# Altium footprint library CONN_B2B_SEARAY.PcbLib: 3 footprints
Each footprint in its own frame and in the unit in brackets; x right, y up, seen from the top. Pads: shape width x height; smd on the part's side, far side on the other; paste and mask are expansions set on the pad; w line width, h text height; cw(c..) or ccw(c..) is an arc to the next point about the centre after c.
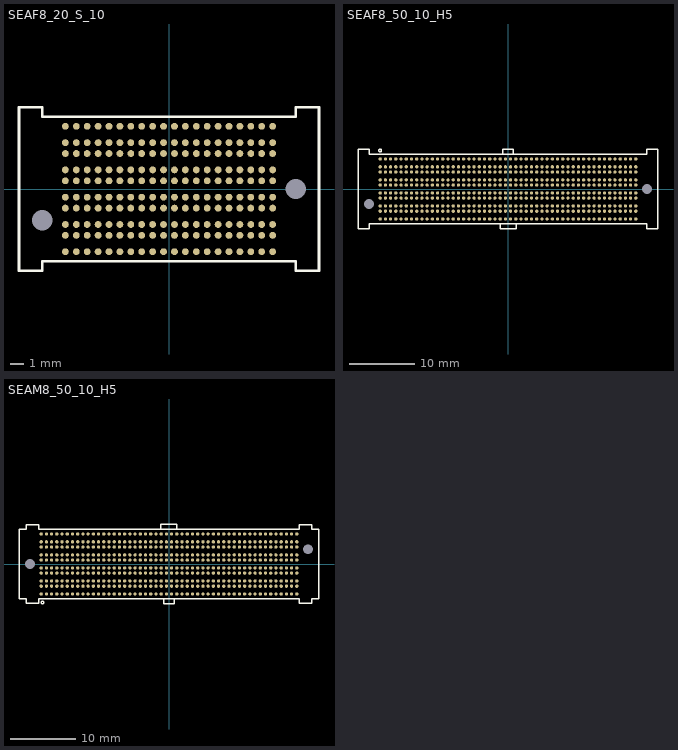
[diagram p0: the footprints below, top view; thin cyan lines are the x and y axes]

## SEAF8_20_S_10 [mm] "CONN, B2B, SAMTEC, SEAF8-20-05.0-S-10-2-K"
pads (402):
  round 0.5 smd paste+0.064 mask+0.05: A1(-7.6,4.6) A2(-6.8,4.6) A3(-6,4.6) A4(-5.2,4.6) A5(-4.4,4.6) A6(-3.6,4.6) A7(-2.8,4.6) A8(-2,4.6) A9(-1.2,4.6) A10(-0.4,4.6) A11(0.4,4.6) A12(1.2,4.6) A13(2,4.6) A14(2.8,4.6) A15(3.6,4.6) A16(4.4,4.6) A17(5.2,4.6) A18(6,4.6) A19(6.8,4.6) A20(7.6,4.6) B1(-7.6,3.4) B2(-6.8,3.4) B3(-6,3.4) B4(-5.2,3.4) B5(-4.4,3.4) B6(-3.6,3.4) B7(-2.8,3.4) B8(-2,3.4) B9(-1.2,3.4) B10(-0.4,3.4) B11(0.4,3.4) B12(1.2,3.4) B13(2,3.4) B14(2.8,3.4) B15(3.6,3.4) B16(4.4,3.4) B17(5.2,3.4) B18(6,3.4) B19(6.8,3.4) B20(7.6,3.4) C1(-7.6,2.6) C2(-6.8,2.6) C3(-6,2.6) C4(-5.2,2.6) C5(-4.4,2.6) C6(-3.6,2.6) C7(-2.8,2.6) C8(-2,2.6) C9(-1.2,2.6) C10(-0.4,2.6) C11(0.4,2.6) C12(1.2,2.6) C13(2,2.6) C14(2.8,2.6) C15(3.6,2.6) C16(4.4,2.6) C17(5.2,2.6) C18(6,2.6) C19(6.8,2.6) C20(7.6,2.6) D1(-7.6,1.4) D2(-6.8,1.4) D3(-6,1.4) D4(-5.2,1.4) D5(-4.4,1.4) D6(-3.6,1.4) D7(-2.8,1.4) D8(-2,1.4) D9(-1.2,1.4) D10(-0.4,1.4) D11(0.4,1.4) D12(1.2,1.4) D13(2,1.4) D14(2.8,1.4) D15(3.6,1.4) D16(4.4,1.4) D17(5.2,1.4) D18(6,1.4) D19(6.8,1.4) D20(7.6,1.4) E1(-7.6,0.6) E2(-6.8,0.6) E3(-6,0.6) E4(-5.2,0.6) E5(-4.4,0.6) E6(-3.6,0.6) E7(-2.8,0.6) E8(-2,0.6) E9(-1.2,0.6) E10(-0.4,0.6) E11(0.4,0.6) E12(1.2,0.6) E13(2,0.6) E14(2.8,0.6) E15(3.6,0.6) E16(4.4,0.6) E17(5.2,0.6) E18(6,0.6) E19(6.8,0.6) E20(7.6,0.6) F1(-7.6,-0.6) F2(-6.8,-0.6) F3(-6,-0.6) F4(-5.2,-0.6) F5(-4.4,-0.6) F6(-3.6,-0.6) F7(-2.8,-0.6) F8(-2,-0.6) F9(-1.2,-0.6) F10(-0.4,-0.6) F11(0.4,-0.6) F12(1.2,-0.6) F13(2,-0.6) F14(2.8,-0.6) F15(3.6,-0.6) F16(4.4,-0.6) F17(5.2,-0.6) F18(6,-0.6) F19(6.8,-0.6) F20(7.6,-0.6) G1(-7.6,-1.4) G2(-6.8,-1.4) G3(-6,-1.4) G4(-5.2,-1.4) G5(-4.4,-1.4) G6(-3.6,-1.4) G7(-2.8,-1.4) G8(-2,-1.4) G9(-1.2,-1.4) G10(-0.4,-1.4) G11(0.4,-1.4) G12(1.2,-1.4) G13(2,-1.4) G14(2.8,-1.4) G15(3.6,-1.4) G16(4.4,-1.4) G17(5.2,-1.4) G18(6,-1.4) G19(6.8,-1.4) G20(7.6,-1.4) H1(-7.6,-2.6) H2(-6.8,-2.6) H3(-6,-2.6) H4(-5.2,-2.6) H5(-4.4,-2.6) H6(-3.6,-2.6) H7(-2.8,-2.6) H8(-2,-2.6) H9(-1.2,-2.6) H10(-0.4,-2.6) H11(0.4,-2.6) H12(1.2,-2.6) H13(2,-2.6) H14(2.8,-2.6) H15(3.6,-2.6) H16(4.4,-2.6) H17(5.2,-2.6) H18(6,-2.6) H19(6.8,-2.6) H20(7.6,-2.6) J1(-7.6,-3.4) J2(-6.8,-3.4) J3(-6,-3.4) J4(-5.2,-3.4) J5(-4.4,-3.4) J6(-3.6,-3.4) J7(-2.8,-3.4) J8(-2,-3.4) J9(-1.2,-3.4) J10(-0.4,-3.4) J11(0.4,-3.4) J12(1.2,-3.4) J13(2,-3.4) J14(2.8,-3.4) J15(3.6,-3.4) J16(4.4,-3.4) J17(5.2,-3.4) J18(6,-3.4) J19(6.8,-3.4) J20(7.6,-3.4) K1(-7.6,-4.6) K2(-6.8,-4.6) K3(-6,-4.6) K4(-5.2,-4.6) K5(-4.4,-4.6) K6(-3.6,-4.6) K7(-2.8,-4.6) K8(-2,-4.6) K9(-1.2,-4.6) K10(-0.4,-4.6) K11(0.4,-4.6) K12(1.2,-4.6) K13(2,-4.6) K14(2.8,-4.6) K15(3.6,-4.6) K16(4.4,-4.6) K17(5.2,-4.6) K18(6,-4.6) K19(6.8,-4.6) K20(7.6,-4.6)
  round 0 hole 1.5 unplated: ""(-9.3,-2.3) ""(9.3,0)
  oval 0.65x0.7 on Top Paste: ""(-7.6,-4.55) ""(-7.6,-3.45) ""(-7.6,-2.55) ""(-7.6,-1.45) ""(-7.6,-0.55) ""(-7.6,0.55) ""(-7.6,1.45) ""(-7.6,2.55) ""(-7.6,3.45) ""(-7.6,4.55) ""(-6.8,-4.55) ""(-6.8,-3.45) ""(-6.8,-2.55) ""(-6.8,-1.45) ""(-6.8,-0.55) ""(-6.8,0.55) ""(-6.8,1.45) ""(-6.8,2.55) ""(-6.8,3.45) ""(-6.8,4.55) ""(-6,-4.55) ""(-6,-3.45) ""(-6,-2.55) ""(-6,-1.45) ""(-6,-0.55) ""(-6,0.55) ""(-6,1.45) ""(-6,2.55) ""(-6,3.45) ""(-6,4.55) ""(-5.2,-4.55) ""(-5.2,-3.45) ""(-5.2,-2.55) ""(-5.2,-1.45) ""(-5.2,-0.55) ""(-5.2,0.55) ""(-5.2,1.45) ""(-5.2,2.55) ""(-5.2,3.45) ""(-5.2,4.55) ""(-4.4,-4.55) ""(-4.4,-3.45) ""(-4.4,-2.55) ""(-4.4,-1.45) ""(-4.4,-0.55) ""(-4.4,0.55) ""(-4.4,1.45) ""(-4.4,2.55) ""(-4.4,3.45) ""(-4.4,4.55) ""(-3.6,-4.55) ""(-3.6,-3.45) ""(-3.6,-2.55) ""(-3.6,-1.45) ""(-3.6,-0.55) ""(-3.6,0.55) ""(-3.6,1.45) ""(-3.6,2.55) ""(-3.6,3.45) ""(-3.6,4.55) ""(-2.8,-4.55) ""(-2.8,-3.45) ""(-2.8,-2.55) ""(-2.8,-1.45) ""(-2.8,-0.55) ""(-2.8,0.55) ""(-2.8,1.45) ""(-2.8,2.55) ""(-2.8,3.45) ""(-2.8,4.55) ""(-2,-4.55) ""(-2,-3.45) ""(-2,-2.55) ""(-2,-1.45) ""(-2,-0.55) ""(-2,0.55) ""(-2,1.45) ""(-2,2.55) ""(-2,3.45) ""(-2,4.55) ""(-1.2,-4.55) ""(-1.2,-3.45) ""(-1.2,-2.55) ""(-1.2,-1.45) ""(-1.2,-0.55) ""(-1.2,0.55) ""(-1.2,1.45) ""(-1.2,2.55) ""(-1.2,3.45) ""(-1.2,4.55) ""(-0.4,-4.55) ""(-0.4,-3.45) ""(-0.4,-2.55) ""(-0.4,-1.45) ""(-0.4,-0.55) ""(-0.4,0.55) ""(-0.4,1.45) ""(-0.4,2.55) ""(-0.4,3.45) ""(-0.4,4.55) ""(0.4,-4.55) ""(0.4,-3.45) ""(0.4,-2.55) ""(0.4,-1.45) ""(0.4,-0.55) ""(0.4,0.55) ""(0.4,1.45) ""(0.4,2.55) ""(0.4,3.45) ""(0.4,4.55) ""(1.2,-4.55) ""(1.2,-3.45) ""(1.2,-2.55) ""(1.2,-1.45) ""(1.2,-0.55) ""(1.2,0.55) ""(1.2,1.45) ""(1.2,2.55) ""(1.2,3.45) ""(1.2,4.55) ""(2,-4.55) ""(2,-3.45) ""(2,-2.55) ""(2,-1.45) ""(2,-0.55) ""(2,0.55) ""(2,1.45) ""(2,2.55) ""(2,3.45) ""(2,4.55) ""(2.8,-4.55) ""(2.8,-3.45) ""(2.8,-2.55) ""(2.8,-1.45) ""(2.8,-0.55) ""(2.8,0.55) ""(2.8,1.45) ""(2.8,2.55) ""(2.8,3.45) ""(2.8,4.55) ""(3.6,-4.55) ""(3.6,-3.45) ""(3.6,-2.55) ""(3.6,-1.45) ""(3.6,-0.55) ""(3.6,0.55) ""(3.6,1.45) ""(3.6,2.55) ""(3.6,3.45) ""(3.6,4.55) ""(4.4,-4.55) ""(4.4,-3.45) ""(4.4,-2.55) ""(4.4,-1.45) ""(4.4,-0.55) ""(4.4,0.55) ""(4.4,1.45) ""(4.4,2.55) ""(4.4,3.45) ""(4.4,4.55) ""(5.2,-4.55) ""(5.2,-3.45) ""(5.2,-2.55) ""(5.2,-1.45) ""(5.2,-0.55) ""(5.2,0.55) ""(5.2,1.45) ""(5.2,2.55) ""(5.2,3.45) ""(5.2,4.55) ""(6,-4.55) ""(6,-3.45) ""(6,-2.55) ""(6,-1.45) ""(6,-0.55) ""(6,0.55) ""(6,1.45) ""(6,2.55) ""(6,3.45) ""(6,4.55) ""(6.8,-4.55) ""(6.8,-3.45) ""(6.8,-2.55) ""(6.8,-1.45) ""(6.8,-0.55) ""(6.8,0.55) ""(6.8,1.45) ""(6.8,2.55) ""(6.8,3.45) ""(6.8,4.55) ""(7.6,-4.55) ""(7.6,-3.45) ""(7.6,-2.55) ""(7.6,-1.45) ""(7.6,-0.55) ""(7.6,0.55) ""(7.6,1.45) ""(7.6,2.55) ""(7.6,3.45) ""(7.6,4.55)
Top Overlay:
  lines w0.2: -11,-6 -11,6 -9.3,6 -9.3,5.3 9.3,5.3 9.3,6 11,6 11,-6 9.3,-6 9.3,-5.3 -9.3,-5.3 -9.3,-6 -11,-6
3D body "SEAF8-20-05.0-S-10-2-K.stp": height 4.65, standoff -1.32, extent -10.92,-5.9 10.92,5.9

## SEAF8_50_10_H5 [mm] "CONN, B2B, SAMTEC, SEAF8-50-05.0-L-10-2-K"
height 5
pads (502):
  round 0.5 smd paste-1 mask+0.05: A01(-19.6,4.6) A02(-18.8,4.6) A03(-18,4.6) A04(-17.2,4.6) A05(-16.4,4.6) A06(-15.6,4.6) A07(-14.8,4.6) A08(-14,4.6) A09(-13.2,4.6) A10(-12.4,4.6) A11(-11.6,4.6) A12(-10.8,4.6) A13(-10,4.6) A14(-9.2,4.6) A15(-8.4,4.6) A16(-7.6,4.6) A17(-6.8,4.6) A18(-6,4.6) A19(-5.2,4.6) A20(-4.4,4.6) A21(-3.6,4.6) A22(-2.8,4.6) A23(-2,4.6) A24(-1.2,4.6) A25(-0.4,4.6) A26(0.4,4.6) A27(1.2,4.6) A28(2,4.6) A29(2.8,4.6) A30(3.6,4.6) A31(4.4,4.6) A32(5.2,4.6) A33(6,4.6) A34(6.8,4.6) A35(7.6,4.6) A36(8.4,4.6) A37(9.2,4.6) A38(10,4.6) A39(10.8,4.6) A40(11.6,4.6) A41(12.4,4.6) A42(13.2,4.6) A43(14,4.6) A44(14.8,4.6) A45(15.6,4.6) A46(16.4,4.6) A47(17.2,4.6) A48(18,4.6) A49(18.8,4.6) A50(19.6,4.6) B01(-19.6,3.4) B02(-18.8,3.4) B03(-18,3.4) B04(-17.2,3.4) B05(-16.4,3.4) B06(-15.6,3.4) B07(-14.8,3.4) B08(-14,3.4) B09(-13.2,3.4) B10(-12.4,3.4) B11(-11.6,3.4) B12(-10.8,3.4) B13(-10,3.4) B14(-9.2,3.4) B15(-8.4,3.4) B16(-7.6,3.4) B17(-6.8,3.4) B18(-6,3.4) B19(-5.2,3.4) B20(-4.4,3.4) B21(-3.6,3.4) B22(-2.8,3.4) B23(-2,3.4) B24(-1.2,3.4) B25(-0.4,3.4) B26(0.4,3.4) B27(1.2,3.4) B28(2,3.4) B29(2.8,3.4) B30(3.6,3.4) B31(4.4,3.4) B32(5.2,3.4) B33(6,3.4) B34(6.8,3.4) B35(7.6,3.4) B36(8.4,3.4) B37(9.2,3.4) B38(10,3.4) B39(10.8,3.4) B40(11.6,3.4) B41(12.4,3.4) B42(13.2,3.4) B43(14,3.4) B44(14.8,3.4) B45(15.6,3.4) B46(16.4,3.4) B47(17.2,3.4) B48(18,3.4) B49(18.8,3.4) B50(19.6,3.4) C01(-19.6,2.6) C02(-18.8,2.6) C03(-18,2.6) C04(-17.2,2.6) C05(-16.4,2.6) C06(-15.6,2.6) C07(-14.8,2.6) C08(-14,2.6) C09(-13.2,2.6) C10(-12.4,2.6) C11(-11.6,2.6) C12(-10.8,2.6) C13(-10,2.6) C14(-9.2,2.6) C15(-8.4,2.6) C16(-7.6,2.6) C17(-6.8,2.6) C18(-6,2.6) C19(-5.2,2.6) C20(-4.4,2.6) C21(-3.6,2.6) C22(-2.8,2.6) C23(-2,2.6) C24(-1.2,2.6) C25(-0.4,2.6) C26(0.4,2.6) C27(1.2,2.6) C28(2,2.6) C29(2.8,2.6) C30(3.6,2.6) C31(4.4,2.6) C32(5.2,2.6) C33(6,2.6) C34(6.8,2.6) C35(7.6,2.6) C36(8.4,2.6) C37(9.2,2.6) C38(10,2.6) C39(10.8,2.6) C40(11.6,2.6) C41(12.4,2.6) C42(13.2,2.6) C43(14,2.6) C44(14.8,2.6) C45(15.6,2.6) C46(16.4,2.6) C47(17.2,2.6) C48(18,2.6) C49(18.8,2.6) C50(19.6,2.6) D01(-19.6,1.4) D02(-18.8,1.4) D03(-18,1.4) D04(-17.2,1.4) D05(-16.4,1.4) D06(-15.6,1.4) D07(-14.8,1.4) D08(-14,1.4) D09(-13.2,1.4) D10(-12.4,1.4) D11(-11.6,1.4) D12(-10.8,1.4) D13(-10,1.4) D14(-9.2,1.4) D15(-8.4,1.4) D16(-7.6,1.4) D17(-6.8,1.4) D18(-6,1.4) D19(-5.2,1.4) D20(-4.4,1.4) D21(-3.6,1.4) D22(-2.8,1.4) D23(-2,1.4) D24(-1.2,1.4) D25(-0.4,1.4) D26(0.4,1.4) D27(1.2,1.4) D28(2,1.4) D29(2.8,1.4) D30(3.6,1.4) D31(4.4,1.4) D32(5.2,1.4) D33(6,1.4) D34(6.8,1.4) D35(7.6,1.4) D36(8.4,1.4) D37(9.2,1.4) D38(10,1.4) D39(10.8,1.4) D40(11.6,1.4) D41(12.4,1.4) D42(13.2,1.4) D43(14,1.4) D44(14.8,1.4) D45(15.6,1.4) D46(16.4,1.4) D47(17.2,1.4) D48(18,1.4) D49(18.8,1.4) D50(19.6,1.4) E01(-19.6,0.6) E02(-18.8,0.6) E03(-18,0.6) E04(-17.2,0.6) E05(-16.4,0.6) E06(-15.6,0.6) E07(-14.8,0.6) E08(-14,0.6) E09(-13.2,0.6) E10(-12.4,0.6) E11(-11.6,0.6) E12(-10.8,0.6) E13(-10,0.6) E14(-9.2,0.6) E15(-8.4,0.6) E16(-7.6,0.6) E17(-6.8,0.6) E18(-6,0.6) E19(-5.2,0.6) E20(-4.4,0.6) E21(-3.6,0.6) E22(-2.8,0.6) E23(-2,0.6) E24(-1.2,0.6) E25(-0.4,0.6) E26(0.4,0.6) E27(1.2,0.6) E28(2,0.6) E29(2.8,0.6) E30(3.6,0.6) E31(4.4,0.6) E32(5.2,0.6) E33(6,0.6) E34(6.8,0.6) E35(7.6,0.6) E36(8.4,0.6) E37(9.2,0.6) E38(10,0.6) E39(10.8,0.6) E40(11.6,0.6) E41(12.4,0.6) E42(13.2,0.6) E43(14,0.6) E44(14.8,0.6) E45(15.6,0.6) E46(16.4,0.6) E47(17.2,0.6) E48(18,0.6) E49(18.8,0.6) E50(19.6,0.6) F01(-19.6,-0.6) F02(-18.8,-0.6) F03(-18,-0.6) F04(-17.2,-0.6) F05(-16.4,-0.6) F06(-15.6,-0.6) F07(-14.8,-0.6) F08(-14,-0.6) F09(-13.2,-0.6) F10(-12.4,-0.6) F11(-11.6,-0.6) F12(-10.8,-0.6) F13(-10,-0.6) F14(-9.2,-0.6) F15(-8.4,-0.6) F16(-7.6,-0.6) F17(-6.8,-0.6) F18(-6,-0.6) F19(-5.2,-0.6) F20(-4.4,-0.6) F21(-3.6,-0.6) F22(-2.8,-0.6) F23(-2,-0.6) F24(-1.2,-0.6) F25(-0.4,-0.6) F26(0.4,-0.6) F27(1.2,-0.6) F28(2,-0.6) F29(2.8,-0.6) F30(3.6,-0.6) F31(4.4,-0.6) F32(5.2,-0.6) F33(6,-0.6) F34(6.8,-0.6) F35(7.6,-0.6) F36(8.4,-0.6) F37(9.2,-0.6) F38(10,-0.6) F39(10.8,-0.6) F40(11.6,-0.6) F41(12.4,-0.6) F42(13.2,-0.6) F43(14,-0.6) F44(14.8,-0.6) F45(15.6,-0.6) F46(16.4,-0.6) F47(17.2,-0.6) F48(18,-0.6) F49(18.8,-0.6) F50(19.6,-0.6) G01(-19.6,-1.4) G02(-18.8,-1.4) G03(-18,-1.4) G04(-17.2,-1.4) G05(-16.4,-1.4) G06(-15.6,-1.4) G07(-14.8,-1.4) G08(-14,-1.4) G09(-13.2,-1.4) G10(-12.4,-1.4) G11(-11.6,-1.4) G12(-10.8,-1.4) G13(-10,-1.4) G14(-9.2,-1.4) G15(-8.4,-1.4) G16(-7.6,-1.4) G17(-6.8,-1.4) G18(-6,-1.4) G19(-5.2,-1.4) G20(-4.4,-1.4) G21(-3.6,-1.4) G22(-2.8,-1.4) G23(-2,-1.4) G24(-1.2,-1.4) G25(-0.4,-1.4) G26(0.4,-1.4) G27(1.2,-1.4) G28(2,-1.4) G29(2.8,-1.4) G30(3.6,-1.4) G31(4.4,-1.4) G32(5.2,-1.4) G33(6,-1.4) G34(6.8,-1.4) G35(7.6,-1.4) G36(8.4,-1.4) G37(9.2,-1.4) G38(10,-1.4) G39(10.8,-1.4) G40(11.6,-1.4) G41(12.4,-1.4) G42(13.2,-1.4) G43(14,-1.4) G44(14.8,-1.4) G45(15.6,-1.4) G46(16.4,-1.4) G47(17.2,-1.4) G48(18,-1.4) G49(18.8,-1.4) G50(19.6,-1.4) H01(-19.6,-2.6) H02(-18.8,-2.6) H03(-18,-2.6) H04(-17.2,-2.6) H05(-16.4,-2.6) H06(-15.6,-2.6) H07(-14.8,-2.6) H08(-14,-2.6) H09(-13.2,-2.6) H10(-12.4,-2.6) H11(-11.6,-2.6) H12(-10.8,-2.6) H13(-10,-2.6) H14(-9.2,-2.6) H15(-8.4,-2.6) H16(-7.6,-2.6) H17(-6.8,-2.6) H18(-6,-2.6) H19(-5.2,-2.6) H20(-4.4,-2.6) H21(-3.6,-2.6) H22(-2.8,-2.6) H23(-2,-2.6) H24(-1.2,-2.6) H25(-0.4,-2.6) H26(0.4,-2.6) H27(1.2,-2.6) H28(2,-2.6) H29(2.8,-2.6) H30(3.6,-2.6) H31(4.4,-2.6) H32(5.2,-2.6) H33(6,-2.6) H34(6.8,-2.6) H35(7.6,-2.6) H36(8.4,-2.6) H37(9.2,-2.6) H38(10,-2.6) H39(10.8,-2.6) H40(11.6,-2.6) H41(12.4,-2.6) H42(13.2,-2.6) H43(14,-2.6) H44(14.8,-2.6) H45(15.6,-2.6) H46(16.4,-2.6) H47(17.2,-2.6) H48(18,-2.6) H49(18.8,-2.6) H50(19.6,-2.6) I01(-19.6,-3.4) I02(-18.8,-3.4) I03(-18,-3.4) I04(-17.2,-3.4) I05(-16.4,-3.4) I06(-15.6,-3.4) I07(-14.8,-3.4) I08(-14,-3.4) I09(-13.2,-3.4) I10(-12.4,-3.4) I11(-11.6,-3.4) I12(-10.8,-3.4) I13(-10,-3.4) I14(-9.2,-3.4) I15(-8.4,-3.4) I16(-7.6,-3.4) I17(-6.8,-3.4) I18(-6,-3.4) I19(-5.2,-3.4) I20(-4.4,-3.4) I21(-3.6,-3.4) I22(-2.8,-3.4) I23(-2,-3.4) I24(-1.2,-3.4) I25(-0.4,-3.4) I26(0.4,-3.4) I27(1.2,-3.4) I28(2,-3.4) I29(2.8,-3.4) I30(3.6,-3.4) I31(4.4,-3.4) I32(5.2,-3.4) I33(6,-3.4) I34(6.8,-3.4) I35(7.6,-3.4) I36(8.4,-3.4) I37(9.2,-3.4) I38(10,-3.4) I39(10.8,-3.4) I40(11.6,-3.4) I41(12.4,-3.4) I42(13.2,-3.4) I43(14,-3.4) I44(14.8,-3.4) I45(15.6,-3.4) I46(16.4,-3.4) I47(17.2,-3.4) I48(18,-3.4) I49(18.8,-3.4) I50(19.6,-3.4) J01(-19.6,-4.6) J02(-18.8,-4.6) J03(-18,-4.6) J04(-17.2,-4.6) J05(-16.4,-4.6) J06(-15.6,-4.6) J07(-14.8,-4.6) J08(-14,-4.6) J09(-13.2,-4.6) J10(-12.4,-4.6) J11(-11.6,-4.6) J12(-10.8,-4.6) J13(-10,-4.6) J14(-9.2,-4.6) J15(-8.4,-4.6) J16(-7.6,-4.6) J17(-6.8,-4.6) J18(-6,-4.6) J19(-5.2,-4.6) J20(-4.4,-4.6) J21(-3.6,-4.6) J22(-2.8,-4.6) J23(-2,-4.6) J24(-1.2,-4.6) J25(-0.4,-4.6) J26(0.4,-4.6) J27(1.2,-4.6) J28(2,-4.6) J29(2.8,-4.6) J30(3.6,-4.6) J31(4.4,-4.6) J32(5.2,-4.6) J33(6,-4.6) J34(6.8,-4.6) J35(7.6,-4.6) J36(8.4,-4.6) J37(9.2,-4.6) J38(10,-4.6) J39(10.8,-4.6) J40(11.6,-4.6) J41(12.4,-4.6) J42(13.2,-4.6) J43(14,-4.6) J44(14.8,-4.6) J45(15.6,-4.6) J46(16.4,-4.6) J47(17.2,-4.6) J48(18,-4.6) J49(18.8,-4.6) J50(19.6,-4.6)
  round 0 hole 1.5 unplated: ""(-21.3,-2.3) ""(21.3,0)
Top Overlay:
  circle w0.2: c-19.6,5.9 r0.2
  lines w0.2: -1.2,-5.3 -1.2,-6.1 1.25,-6.1 1.25,-5.3 ; -0.8,5.3 -0.8,6.1 0.8,6.1 0.8,5.3 ; -23,-6.1 -21.3,-6.1 -21.3,-5.3 21.3,-5.3 21.3,-6.1 23,-6.1 23,6.1 21.3,6.1 21.3,5.3 -21.3,5.3 -21.3,6.1 -23,6.1 -23,-6.1
Top Paste:
  drawing of 500 lines, arcs and shapes, not listed
3D body "SEAF8-50-05.0-L-10-2-K.stp": height 4.65, standoff -1.32, extent -22.92,-5.98 22.92,5.98

## SEAM8_50_10_H5 [mm] "CONN, B2B, SAMTEC, SEAM8-50-S02.0-L-10-2"
height 5
pads (502):
  round 0.5 smd paste-1 mask+0.05: A01(-19.6,-4.6) A02(-18.8,-4.6) A03(-18,-4.6) A04(-17.2,-4.6) A05(-16.4,-4.6) A06(-15.6,-4.6) A07(-14.8,-4.6) A08(-14,-4.6) A09(-13.2,-4.6) A10(-12.4,-4.6) A11(-11.6,-4.6) A12(-10.8,-4.6) A13(-10,-4.6) A14(-9.2,-4.6) A15(-8.4,-4.6) A16(-7.6,-4.6) A17(-6.8,-4.6) A18(-6,-4.6) A19(-5.2,-4.6) A20(-4.4,-4.6) A21(-3.6,-4.6) A22(-2.8,-4.6) A23(-2,-4.6) A24(-1.2,-4.6) A25(-0.4,-4.6) A26(0.4,-4.6) A27(1.2,-4.6) A28(2,-4.6) A29(2.8,-4.6) A30(3.6,-4.6) A31(4.4,-4.6) A32(5.2,-4.6) A33(6,-4.6) A34(6.8,-4.6) A35(7.6,-4.6) A36(8.4,-4.6) A37(9.2,-4.6) A38(10,-4.6) A39(10.8,-4.6) A40(11.6,-4.6) A41(12.4,-4.6) A42(13.2,-4.6) A43(14,-4.6) A44(14.8,-4.6) A45(15.6,-4.6) A46(16.4,-4.6) A47(17.2,-4.6) A48(18,-4.6) A49(18.8,-4.6) A50(19.6,-4.6) B01(-19.6,-3.4) B02(-18.8,-3.4) B03(-18,-3.4) B04(-17.2,-3.4) B05(-16.4,-3.4) B06(-15.6,-3.4) B07(-14.8,-3.4) B08(-14,-3.4) B09(-13.2,-3.4) B10(-12.4,-3.4) B11(-11.6,-3.4) B12(-10.8,-3.4) B13(-10,-3.4) B14(-9.2,-3.4) B15(-8.4,-3.4) B16(-7.6,-3.4) B17(-6.8,-3.4) B18(-6,-3.4) B19(-5.2,-3.4) B20(-4.4,-3.4) B21(-3.6,-3.4) B22(-2.8,-3.4) B23(-2,-3.4) B24(-1.2,-3.4) B25(-0.4,-3.4) B26(0.4,-3.4) B27(1.2,-3.4) B28(2,-3.4) B29(2.8,-3.4) B30(3.6,-3.4) B31(4.4,-3.4) B32(5.2,-3.4) B33(6,-3.4) B34(6.8,-3.4) B35(7.6,-3.4) B36(8.4,-3.4) B37(9.2,-3.4) B38(10,-3.4) B39(10.8,-3.4) B40(11.6,-3.4) B41(12.4,-3.4) B42(13.2,-3.4) B43(14,-3.4) B44(14.8,-3.4) B45(15.6,-3.4) B46(16.4,-3.4) B47(17.2,-3.4) B48(18,-3.4) B49(18.8,-3.4) B50(19.6,-3.4) C01(-19.6,-2.6) C02(-18.8,-2.6) C03(-18,-2.6) C04(-17.2,-2.6) C05(-16.4,-2.6) C06(-15.6,-2.6) C07(-14.8,-2.6) C08(-14,-2.6) C09(-13.2,-2.6) C10(-12.4,-2.6) C11(-11.6,-2.6) C12(-10.8,-2.6) C13(-10,-2.6) C14(-9.2,-2.6) C15(-8.4,-2.6) C16(-7.6,-2.6) C17(-6.8,-2.6) C18(-6,-2.6) C19(-5.2,-2.6) C20(-4.4,-2.6) C21(-3.6,-2.6) C22(-2.8,-2.6) C23(-2,-2.6) C24(-1.2,-2.6) C25(-0.4,-2.6) C26(0.4,-2.6) C27(1.2,-2.6) C28(2,-2.6) C29(2.8,-2.6) C30(3.6,-2.6) C31(4.4,-2.6) C32(5.2,-2.6) C33(6,-2.6) C34(6.8,-2.6) C35(7.6,-2.6) C36(8.4,-2.6) C37(9.2,-2.6) C38(10,-2.6) C39(10.8,-2.6) C40(11.6,-2.6) C41(12.4,-2.6) C42(13.2,-2.6) C43(14,-2.6) C44(14.8,-2.6) C45(15.6,-2.6) C46(16.4,-2.6) C47(17.2,-2.6) C48(18,-2.6) C49(18.8,-2.6) C50(19.6,-2.6) D01(-19.6,-1.4) D02(-18.8,-1.4) D03(-18,-1.4) D04(-17.2,-1.4) D05(-16.4,-1.4) D06(-15.6,-1.4) D07(-14.8,-1.4) D08(-14,-1.4) D09(-13.2,-1.4) D10(-12.4,-1.4) D11(-11.6,-1.4) D12(-10.8,-1.4) D13(-10,-1.4) D14(-9.2,-1.4) D15(-8.4,-1.4) D16(-7.6,-1.4) D17(-6.8,-1.4) D18(-6,-1.4) D19(-5.2,-1.4) D20(-4.4,-1.4) D21(-3.6,-1.4) D22(-2.8,-1.4) D23(-2,-1.4) D24(-1.2,-1.4) D25(-0.4,-1.4) D26(0.4,-1.4) D27(1.2,-1.4) D28(2,-1.4) D29(2.8,-1.4) D30(3.6,-1.4) D31(4.4,-1.4) D32(5.2,-1.4) D33(6,-1.4) D34(6.8,-1.4) D35(7.6,-1.4) D36(8.4,-1.4) D37(9.2,-1.4) D38(10,-1.4) D39(10.8,-1.4) D40(11.6,-1.4) D41(12.4,-1.4) D42(13.2,-1.4) D43(14,-1.4) D44(14.8,-1.4) D45(15.6,-1.4) D46(16.4,-1.4) D47(17.2,-1.4) D48(18,-1.4) D49(18.8,-1.4) D50(19.6,-1.4) E01(-19.6,-0.6) E02(-18.8,-0.6) E03(-18,-0.6) E04(-17.2,-0.6) E05(-16.4,-0.6) E06(-15.6,-0.6) E07(-14.8,-0.6) E08(-14,-0.6) E09(-13.2,-0.6) E10(-12.4,-0.6) E11(-11.6,-0.6) E12(-10.8,-0.6) E13(-10,-0.6) E14(-9.2,-0.6) E15(-8.4,-0.6) E16(-7.6,-0.6) E17(-6.8,-0.6) E18(-6,-0.6) E19(-5.2,-0.6) E20(-4.4,-0.6) E21(-3.6,-0.6) E22(-2.8,-0.6) E23(-2,-0.6) E24(-1.2,-0.6) E25(-0.4,-0.6) E26(0.4,-0.6) E27(1.2,-0.6) E28(2,-0.6) E29(2.8,-0.6) E30(3.6,-0.6) E31(4.4,-0.6) E32(5.2,-0.6) E33(6,-0.6) E34(6.8,-0.6) E35(7.6,-0.6) E36(8.4,-0.6) E37(9.2,-0.6) E38(10,-0.6) E39(10.8,-0.6) E40(11.6,-0.6) E41(12.4,-0.6) E42(13.2,-0.6) E43(14,-0.6) E44(14.8,-0.6) E45(15.6,-0.6) E46(16.4,-0.6) E47(17.2,-0.6) E48(18,-0.6) E49(18.8,-0.6) E50(19.6,-0.6) F01(-19.6,0.6) F02(-18.8,0.6) F03(-18,0.6) F04(-17.2,0.6) F05(-16.4,0.6) F06(-15.6,0.6) F07(-14.8,0.6) F08(-14,0.6) F09(-13.2,0.6) F10(-12.4,0.6) F11(-11.6,0.6) F12(-10.8,0.6) F13(-10,0.6) F14(-9.2,0.6) F15(-8.4,0.6) F16(-7.6,0.6) F17(-6.8,0.6) F18(-6,0.6) F19(-5.2,0.6) F20(-4.4,0.6) F21(-3.6,0.6) F22(-2.8,0.6) F23(-2,0.6) F24(-1.2,0.6) F25(-0.4,0.6) F26(0.4,0.6) F27(1.2,0.6) F28(2,0.6) F29(2.8,0.6) F30(3.6,0.6) F31(4.4,0.6) F32(5.2,0.6) F33(6,0.6) F34(6.8,0.6) F35(7.6,0.6) F36(8.4,0.6) F37(9.2,0.6) F38(10,0.6) F39(10.8,0.6) F40(11.6,0.6) F41(12.4,0.6) F42(13.2,0.6) F43(14,0.6) F44(14.8,0.6) F45(15.6,0.6) F46(16.4,0.6) F47(17.2,0.6) F48(18,0.6) F49(18.8,0.6) F50(19.6,0.6) G01(-19.6,1.4) G02(-18.8,1.4) G03(-18,1.4) G04(-17.2,1.4) G05(-16.4,1.4) G06(-15.6,1.4) G07(-14.8,1.4) G08(-14,1.4) G09(-13.2,1.4) G10(-12.4,1.4) G11(-11.6,1.4) G12(-10.8,1.4) G13(-10,1.4) G14(-9.2,1.4) G15(-8.4,1.4) G16(-7.6,1.4) G17(-6.8,1.4) G18(-6,1.4) G19(-5.2,1.4) G20(-4.4,1.4) G21(-3.6,1.4) G22(-2.8,1.4) G23(-2,1.4) G24(-1.2,1.4) G25(-0.4,1.4) G26(0.4,1.4) G27(1.2,1.4) G28(2,1.4) G29(2.8,1.4) G30(3.6,1.4) G31(4.4,1.4) G32(5.2,1.4) G33(6,1.4) G34(6.8,1.4) G35(7.6,1.4) G36(8.4,1.4) G37(9.2,1.4) G38(10,1.4) G39(10.8,1.4) G40(11.6,1.4) G41(12.4,1.4) G42(13.2,1.4) G43(14,1.4) G44(14.8,1.4) G45(15.6,1.4) G46(16.4,1.4) G47(17.2,1.4) G48(18,1.4) G49(18.8,1.4) G50(19.6,1.4) H01(-19.6,2.6) H02(-18.8,2.6) H03(-18,2.6) H04(-17.2,2.6) H05(-16.4,2.6) H06(-15.6,2.6) H07(-14.8,2.6) H08(-14,2.6) H09(-13.2,2.6) H10(-12.4,2.6) H11(-11.6,2.6) H12(-10.8,2.6) H13(-10,2.6) H14(-9.2,2.6) H15(-8.4,2.6) H16(-7.6,2.6) H17(-6.8,2.6) H18(-6,2.6) H19(-5.2,2.6) H20(-4.4,2.6) H21(-3.6,2.6) H22(-2.8,2.6) H23(-2,2.6) H24(-1.2,2.6) H25(-0.4,2.6) H26(0.4,2.6) H27(1.2,2.6) H28(2,2.6) H29(2.8,2.6) H30(3.6,2.6) H31(4.4,2.6) H32(5.2,2.6) H33(6,2.6) H34(6.8,2.6) H35(7.6,2.6) H36(8.4,2.6) H37(9.2,2.6) H38(10,2.6) H39(10.8,2.6) H40(11.6,2.6) H41(12.4,2.6) H42(13.2,2.6) H43(14,2.6) H44(14.8,2.6) H45(15.6,2.6) H46(16.4,2.6) H47(17.2,2.6) H48(18,2.6) H49(18.8,2.6) H50(19.6,2.6) I01(-19.6,3.4) I02(-18.8,3.4) I03(-18,3.4) I04(-17.2,3.4) I05(-16.4,3.4) I06(-15.6,3.4) I07(-14.8,3.4) I08(-14,3.4) I09(-13.2,3.4) I10(-12.4,3.4) I11(-11.6,3.4) I12(-10.8,3.4) I13(-10,3.4) I14(-9.2,3.4) I15(-8.4,3.4) I16(-7.6,3.4) I17(-6.8,3.4) I18(-6,3.4) I19(-5.2,3.4) I20(-4.4,3.4) I21(-3.6,3.4) I22(-2.8,3.4) I23(-2,3.4) I24(-1.2,3.4) I25(-0.4,3.4) I26(0.4,3.4) I27(1.2,3.4) I28(2,3.4) I29(2.8,3.4) I30(3.6,3.4) I31(4.4,3.4) I32(5.2,3.4) I33(6,3.4) I34(6.8,3.4) I35(7.6,3.4) I36(8.4,3.4) I37(9.2,3.4) I38(10,3.4) I39(10.8,3.4) I40(11.6,3.4) I41(12.4,3.4) I42(13.2,3.4) I43(14,3.4) I44(14.8,3.4) I45(15.6,3.4) I46(16.4,3.4) I47(17.2,3.4) I48(18,3.4) I49(18.8,3.4) I50(19.6,3.4) J01(-19.6,4.6) J02(-18.8,4.6) J03(-18,4.6) J04(-17.2,4.6) J05(-16.4,4.6) J06(-15.6,4.6) J07(-14.8,4.6) J08(-14,4.6) J09(-13.2,4.6) J10(-12.4,4.6) J11(-11.6,4.6) J12(-10.8,4.6) J13(-10,4.6) J14(-9.2,4.6) J15(-8.4,4.6) J16(-7.6,4.6) J17(-6.8,4.6) J18(-6,4.6) J19(-5.2,4.6) J20(-4.4,4.6) J21(-3.6,4.6) J22(-2.8,4.6) J23(-2,4.6) J24(-1.2,4.6) J25(-0.4,4.6) J26(0.4,4.6) J27(1.2,4.6) J28(2,4.6) J29(2.8,4.6) J30(3.6,4.6) J31(4.4,4.6) J32(5.2,4.6) J33(6,4.6) J34(6.8,4.6) J35(7.6,4.6) J36(8.4,4.6) J37(9.2,4.6) J38(10,4.6) J39(10.8,4.6) J40(11.6,4.6) J41(12.4,4.6) J42(13.2,4.6) J43(14,4.6) J44(14.8,4.6) J45(15.6,4.6) J46(16.4,4.6) J47(17.2,4.6) J48(18,4.6) J49(18.8,4.6) J50(19.6,4.6)
  round 0 hole 1.5 unplated: ""(-21.3,0) ""(21.3,2.25)
Top Overlay:
  circle w0.2: c-19.4,-5.9 r0.2
  lines w0.2: -1.25,5.3 -1.25,6.1 1.2,6.1 1.2,5.3 ; -0.8,-5.3 -0.8,-6.1 0.8,-6.1 0.8,-5.3 ; -23,-5.3 -23,5.3 -21.9,5.3 -21.9,6 -20,6 -20,5.3 20,5.3 20,6 21.9,6 21.9,5.3 23,5.3 23,-5.3 21.9,-5.3 21.9,-6 20,-6 20,-5.3 -20,-5.3 -20,-6 -21.9,-6 -21.9,-5.3 -23,-5.3
Top Paste:
  drawing of 500 lines, arcs and shapes, not listed
3D body "SEAM8-50-S02.0-L-10-2.stp": height 5.63, standoff -1.2, extent -22.92,-5.9 22.92,5.9